# Altium footprint library MH_DA_THU_VIEN_16122016.PcbLib: 531 footprints (part 32 of 34)
Each footprint in its own frame and in the unit in brackets; x right, y up, seen from the top. Pads: shape width x height; smd on the part's side, far side on the other; paste and mask are expansions set on the pad; w line width, h text height; cw(c..) or ccw(c..) is an arc to the next point about the centre after c.
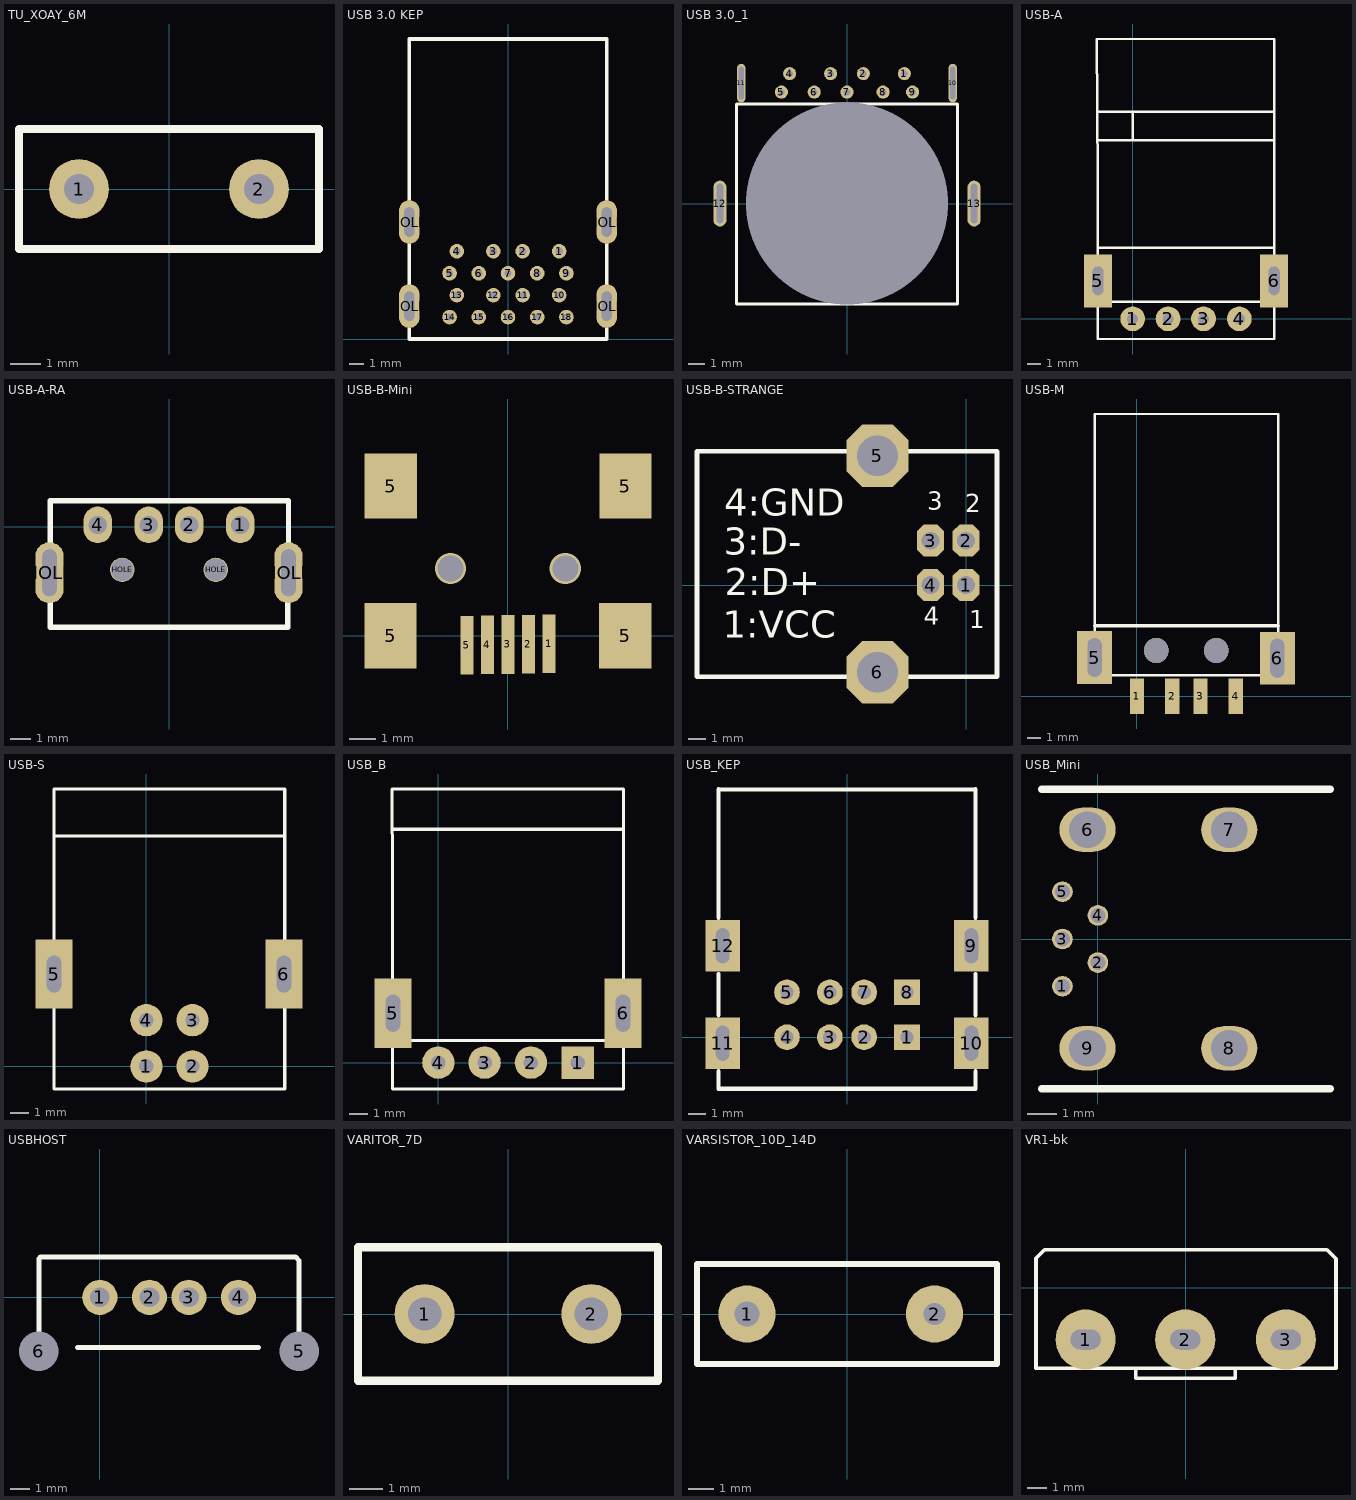
[diagram p31: the footprints below, top view; thin cyan lines are the x and y axes]

## TU_XOAY_6M [mm]
pads (2):
  round 2 hole 1: 1(-3,0) 2(3,0)
Top Overlay:
  lines w0.254: -5,-2 5,-2 5,2 -5,2 -5,-2
3D body: height 3.42, standoff -3.69, extent -3.426,-3.43 3.426,3.43

## USB 3.0 KEP [mm]
pads (22):
  round 1 hole 0.5: 1(3.5,6) 2(1,6) 3(-1,6) 4(-3.5,6) 5(-4,4.5) 6(-2,4.5) 7(0,4.5) 8(2,4.5) 9(4,4.5) 10(3.5,3) 11(1,3) 12(-1,3) 13(-3.5,3) 14(-4,1.5) 15(-2,1.5) 16(0,1.5) 17(2,1.5) 18(4,1.5)
  oval 1.4x3 hole 0.7 slot 2 at 90 deg: HOLE(-6.75,2.25) HOLE(-6.75,8) HOLE(6.75,2.25) HOLE(6.75,8)
Top Overlay:
  lines w0.254: -6.756,0 -6.756,0.711 ; -6.756,3.734 -6.756,6.477 ; -6.756,9.5 -6.756,20.523 6.756,20.523 6.756,9.525 ; -6.75,0 6.75,0 ; 6.756,0.025 6.756,0.737 ; 6.756,3.759 6.756,6.502
3D body: height 16.71, standoff -2.9, extent -7.744,0.16 7.843,20.66

## USB 3.0_1 [mm]
pads (14):
  round 0 hole 12.3 square: 0(0,0)
  round 0.8 hole 0.4: 1(3.5,7.925) 2(1,7.925) 3(-1,7.925) 4(-3.5,7.925) 5(-4,6.8) 6(-2,6.8) 7(0,6.8) 8(2.2,6.8) 9(4,6.8)
  oval 0.5x2.35 hole 0.3 slot 2 at 90 deg: 10(6.45,7.35) 11(-6.45,7.35)
  oval 0.8x2.8 hole 0.4 slot 2.4 at 90 deg: 12(-7.75,0) 13(7.75,0)
Top Overlay:
  lines w0.178: -6.731,-6.121 6.731,-6.121 6.731,6.071 -6.731,6.071 -6.731,-6.121

## USB-A [mil]
pads (6):
  round 70 hole 31: 1(0,0) 2(100,0) 3(200,0) 4(301,0)
  rect 80x150 hole 31 slot 80 at 90 deg: 5(-98,107) 6(399,107)
Top Overlay:
  lines w7: -99,200 400,200 ; -99,504 400,504 ; -99,584 400,584 ; -98,48 401,48 ; 0,504 0,584 ; -101.03,790 -99,397 -99,-57 400,-57 400,790 -101.03,790
3D body: height 177.17, standoff -51.16, extent -97.29,-0.22 399,784.22

## USB-A-RA [mm] "USB Type A"
pads (8):
  oval 1.4x1.8 hole 0.9: 1(3.5,0.08) 2(1,0.08) 3(-1,0.08) 4(-3.5,0.08)
  oval 1.4x3 hole 0.7 slot 2.3 at 90 deg: HOLE(-5.875,-2.27) HOLE(5.875,-2.27)
  round 1.2 hole 1.1: HOLE(-2.3,-2.13) HOLE(2.3,-2.13)
Top Overlay:
  lines w0.254: 5.842,-2.27 5.842,-4.953 -5.842,-4.953 -5.842,1.27 5.875,1.27 5.875,-2.27
Keep-Out Layer:
  lines w0.254: 5.842,-2.27 5.875,-2.27
3D body: height 2.18, standoff -3.52, extent -6.25,-19.8 6.25,0.23

## USB-B-Mini [mm]
pads (9):
  rect 0.5x2.25 smd: 1(1.575,-0.305) 2(0.787,-0.318) 3(0,-0.33) 4(-0.787,-0.343) 5(-1.575,-0.356)
  rect 2x2.5 smd: 5(-4.5,0) 5(-4.496,5.74) 5(4.5,0) 5(4.504,5.74)
via -2.2,2.58 diameter 1.2 hole 1
via 2.2,2.58 diameter 1.2 hole 1
3D body: height 3.95, standoff -1, extent -5.35,-0.673 5.35,8.527

## USB-B-STRANGE [mm] "USB Type B - STRANGE - Slave Device"
pads (6):
  oct 1.5x1.8 hole 1: 1(0,0) 2(0,2.5) 3(-2,2.5) 4(-2,0)
  oct 3.5x3.5 hole 2.3: 5(-4.988,7.283) 6(-4.988,-4.909)
Top Overlay:
  lines w0.254: -15.148,-5.163 -15.148,7.537 1.743,7.537 1.743,-5.163 -15.148,-5.163
  text "1:VCC" at -13.701,-2.978 h1.52
  text "2:D+" at -13.574,-0.565 h1.52
  text "3:D-" at -13.65,1.695 h1.52
  text "4:GND" at -13.624,3.905 h1.52
  text "1" at 0.193,-2.42 h1
  text "3" at -2.194,4.235 h1
  text "2" at -0.035,4.108 h1
  text "4" at -2.372,-2.242 h1
3D body: height 10.98, standoff -3.24, extent -15.45,-6.179 0.85,8.68

## USB-M [mil] "For USB SMD"
height 150
pads (6):
  rect 40x100 smd: 1(0,0) 2(100,0) 3(180,0) 4(280,0)
  rect 100x150 hole 40 slot 110 at 90 deg: 5(-120,110) 6(398,108)
via 225,130 diameter 70 hole 70
via 55,130 diameter 70 hole 70
Top Overlay:
  lines w7: -120,60 -120,800 400,800 400,60 -120,60
  lines w10: -120,200 400,200

## USB-S [mil] "USB B connector, 4pin, For Print"
height 100
pads (6):
  round 70 hole 31: 1(0,0) 2(100,0) 3(100,100) 4(0,100)
  rect 80x150 hole 31 slot 80 at 90 deg: 5(-200,200) 6(298,200)
Top Overlay:
  lines w7: -200,499 300,499 ; -200,-49 300,-49 300,601 -200,601 -200,-49
3D body: height 421.26, standoff -155.51, extent -243.31,-39.61 343.31,610

## USB_B [mil] "USB A connector, 4pin, For USB sing"
height 100
pads (6):
  rect 70x70 hole 31: 1(301,0)
  round 70 hole 31: 2(200,0) 3(100,0) 4(0,0)
  rect 80x150 hole 31 slot 80 at 90 deg: 5(-98,107) 6(399,107)
Top Overlay:
  lines w7: -99,504 400,504 ; -98,48 401,48 ; -100,591 400,591 400,-57 -99,-57 -99,397 -100,591
3D body: height 277.51, standoff -149.84, extent -162.02,-58 460.02,512.87

## USB_KEP [mm]
pads (12):
  rect 1.5x1.5 hole 0.787: 1(3.5,0) 8(3.5,2.62)
  round 1.5 hole 0.787: 2(1,0) 3(-1,0) 4(-3.5,0) 5(-3.5,2.62) 6(-1,2.62) 7(1,2.62)
  rect 2.032x3 hole 0.787 slot 2.032 at 90 deg: 9(7.25,5.33) 10(7.25,-0.35) 11(-7.25,-0.35) 12(-7.25,5.33)
Top Overlay:
  lines w0.254: -7.5,-3 7.5,-3 ; -7.5,14.45 7.5,14.45 ; -7.493,-2.997 -7.493,-1.981 ; -7.493,1.27 -7.493,3.683 ; -7.493,6.96 -7.493,14.453 ; 7.493,-2.997 7.493,-1.981 ; 7.493,1.27 7.493,3.683 ; 7.493,6.96 7.493,14.453
3D body: height 16.1, standoff -3.3, extent -7.826,-1.357 7.874,16.241

## USB_Mini [mm]
pads (9):
  round 0.7 hole 0.5: 1(-1.2,-1.6) 2(0,-0.8) 3(-1.2,0) 4(0,0.8) 5(-1.2,1.6)
  oval 1.9x1.5 hole 1.25: 6(-0.35,3.7) 7(4.45,3.7) 8(4.45,-3.7) 9(-0.35,-3.7)
Top Overlay:
  lines w0.254: -1.905,-5.08 7.874,-5.08 ; -1.905,5.08 7.874,5.08

## USBHOST [mil]
pads (6):
  round 70 hole 39.37 unplated: 1(0,0) 2(98.6,0) 3(177.1,0) 4(275.6,0)
  round 70 hole 78.74 unplated: 5(396.6,-107) 6(-121.4,-107)
Top Overlay:
  lines w10: -121.4,-107 -121.4,77 -118.4,80 389.6,80 396.6,73 396.6,-107 ; -44.4,-100 315.6,-100

## VARITOR_7D [mm]
pads (2):
  round 1.8 hole 1: 1(-2.5,0) 2(2.5,0)
Top Overlay:
  lines w0.254: -4.5,-2 4.5,-2 4.5,2 -4.5,2 -4.5,-2
3D body: height 10, standoff -2.57, extent -4,-1.26 4,1.25

## VARSISTOR_10D_14D [mil] "VARSISTOR_10D"
pads (2):
  round 90 hole 39.37: 1(-157.48,0)
  round 90 hole 35: 2(137.8,0)
Top Overlay:
  lines w10: -236.22,-78.74 236.22,-78.74 236.22,78.74 -236.22,78.74 -236.22,-78.74
3D body: height 521.65, standoff -226.38, extent -255.89,-62.99 236.22,157.48

## VR1-bk [mil]
pads (3):
  round 120 hole 40 slot 60 at 0 deg: 1(-199.72,-103.39) 2(-0.72,-103.39) 3(200.28,-103.39)
Top Overlay:
  lines w7: -99.72,-160.39 -99.72,-180.39 99.28,-180.39 99.28,-160.39 ; -298.72,-160.39 -298.72,58.61 -281.72,75.61 282.28,75.61 300.28,57.61 300.28,-160.39 -298.72,-160.39
3D body: height 777.56, standoff -137.8, extent -334.6,-1167.95 315,87.95